# Altium footprint library SPECIAL.PcbLib: 68 footprints (part 2 of 5)
Each footprint in its own frame and in the unit in brackets; x right, y up, seen from the top. Pads: shape width x height; smd on the part's side, far side on the other; paste and mask are expansions set on the pad; w line width, h text height; cw(c..) or ccw(c..) is an arc to the next point about the centre after c.
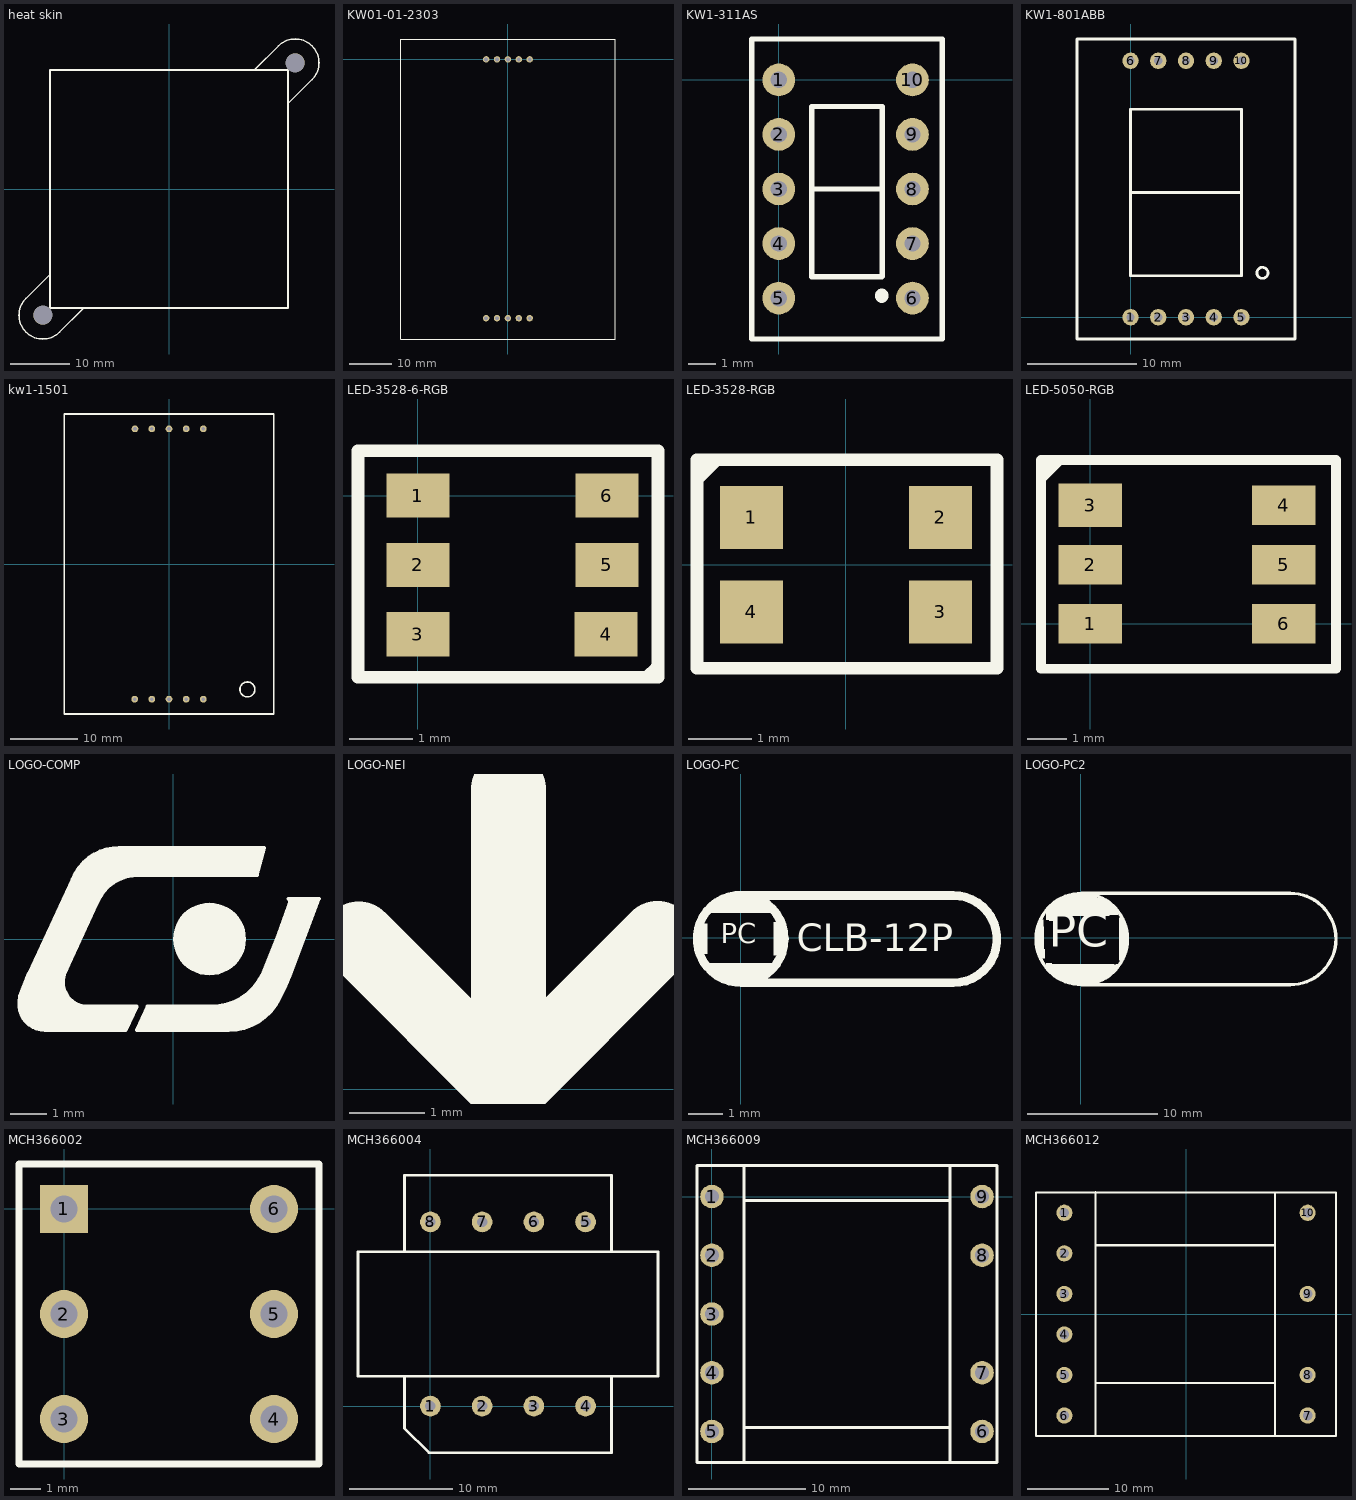
[diagram p1: the footprints below, top view; thin cyan lines are the x and y axes]

## heat skin [mm]
pads (2):
  round 3.2 hole 3.2 unplated: ""(-21.21,-21.21) ""(21.21,21.21)
Top Overlay:
  lines w0.254: -24.038,-18.382 ccw(c-21.21,-21.21) -18.382,-24.038 ; -24.038,-18.38 -20.014,-14.356 ; -18.382,-24.04 -14.366,-20.024 ; 14.376,20.034 18.382,24.04 ; 18.382,24.038 cw(c21.21,21.21) 24.038,18.382 ; 20.009,14.351 24.038,18.38 ; -20,-20 -20,20 20,20 20,-20 -20,-20

## KW01-01-2303 [mm]
pads (10):
  round 1.5 hole 0.9: 1(-5.08,-60.396) 2(-2.54,-60.396) 3(0,-60.396) 4(2.54,-60.396) 5(5.08,-60.396) 6(5.08,0) 7(2.54,0) 8(0,0) 9(-2.54,0) 10(-5.08,0)
Top Overlay:
  lines w0.254: 25,-65.246 -25,-65.246 -25,4.754 25,4.754 ; 25.038,-65.246 25.038,4.754
3D body "User Library-King Bright SA23-11.STEP": height 12, standoff -4, extent -23.974,-65.3 24.026,4.7

## KW1-311AS [mm]
height 5
pads (10):
  round 1.2 hole 0.6: 1(0,0) 2(0,-2) 3(0,-4) 4(0,-6) 5(0,-8) 6(4.9,-8) 7(4.9,-6) 8(4.9,-4) 9(4.9,-2) 10(4.9,0)
Top Overlay:
  lines w0.2: 1.2,-4 3.8,-4 ; 3.775,-7.225 1.2,-7.225 1.2,-0.975 3.8,-0.975 3.8,-7.2 ; -1,-9.5 6,-9.5 6,1.5 -1,1.5 -1,-9.5
  lines w0.5: 3.775,-7.925 3.775,-7.9
3D body: height 5.01, standoff 5, extent 4.902,-8.5 5.5,-7.901
3D body: height 5.01, standoff 5, extent 0.651,-4.546 4.351,-3.546
3D body: height 5.01, standoff 5, extent 3.852,-3.846 4.852,-0.146
3D body: height 5.01, standoff 5, extent 3.851,-7.946 4.851,-4.246
3D body: height 5.01, standoff 5, extent 0.651,-8.445 4.351,-7.445
3D body: height 5.01, standoff 5, extent 0.151,-7.946 1.151,-4.246
3D body: height 5.01, standoff 5, extent 0.152,-3.845 1.152,-0.145
3D body: height 5.01, standoff 5, extent 0.652,-0.647 4.352,0.353
3D body: height 0, standoff -2, extent -0.223,-0.224 0.225,0.225
3D body: height 0, standoff -2, extent -0.223,-2.224 0.225,-1.775
3D body: height 0, standoff -2, extent -0.223,-4.224 0.225,-3.775
3D body: height 0, standoff -2, extent -0.223,-6.224 0.225,-5.775
3D body: height 0, standoff -2, extent -0.223,-8.224 0.225,-7.775
3D body: height 0, standoff -2, extent 4.677,-8.224 5.125,-7.775
3D body: height 0, standoff -2, extent 4.677,-6.224 5.125,-5.775
3D body: height 0, standoff -2, extent 4.677,-4.224 5.125,-3.775
3D body: height 0, standoff -2, extent 4.677,-2.224 5.125,-1.775
3D body: height 0, standoff -2, extent 4.677,-0.224 5.125,0.225
3D body: height 5, standoff 4.99, extent -1,-9.5 6,1.5
3D body: height 4.99, standoff 0.5, extent -1,-9.5 6,1.5
3D body: height 0.5, standoff 0.49, extent -0.5,-9 5.5,1
3D body: height 0.5, standoff 0, extent -1,-9.5 0,-8.5
3D body: height 0.5, standoff 0, extent 5,-9.5 6,-8.5
3D body: height 0.5, standoff 0, extent 5,0.5 6,1.5
3D body: height 0.5, standoff 0, extent -1,0.5 0,1.5

## KW1-801ABB [mm]
height 10
pads (10):
  round 1.5 hole 0.75: 1(0,0) 2(2.54,0) 3(5.08,0) 4(7.62,0) 5(10.16,0) 6(0,23.5) 7(2.54,23.5) 8(5.08,23.5) 9(7.62,23.5) 10(10.16,23.5)
Top Overlay:
  circle w0.25: c12.087,4.064 r0.508
  lines w0.25: 0,11.43 0,19.05 10.16,19.05 10.16,11.43 ; 0,11.43 10.16,11.43 ; 0,11.43 0,3.81 10.16,3.81 10.16,11.43 ; 0,11.43 10.16,11.43 ; -4.92,-2 15.08,-2 15.08,25.5 -4.92,25.5 -4.92,-2
3D body: height 9.9, standoff 9.9, extent 0.419,10.891 10.729,12.636
3D body: height 9.9, standoff 9.9, extent 10.425,12.104 13.695,22.393
3D body: height 9.9, standoff 9.9, extent 2.185,21.718 12.843,23.468
3D body: height 9.9, standoff 9.9, extent -2.547,1.129 0.722,11.418
3D body: height 9.9, standoff 9.9, extent -0.577,12.102 2.632,22.452
3D body: height 9.9, standoff 9.9, extent 8.513,1.068 11.722,11.418
3D body: height 9.9, standoff 9.9, extent -1.696,0.053 8.962,1.803
3D body: height 9.9, standoff 9.9, extent 11.104,-0.119 12.698,1.478
3D body: height 1.5, standoff 0, extent -4.92,-2 -2.92,0
3D body: height 1.5, standoff 0, extent 13.08,23.2 15.08,25.2
3D body: height 1.5, standoff 0, extent -4.92,23.2 -2.92,25.2
3D body: height 1.5, standoff 0, extent 13.08,-2 15.08,0
3D body: height 9.9, standoff 1, extent -3.92,-1 14.08,24.2
3D body: height 9.8, standoff 1, extent -4.92,24.2 15.08,25.2
3D body: height 9.8, standoff 1, extent -4.92,-2 15.08,-1
3D body: height 9.8, standoff 1, extent -4.92,-1 -3.92,24.2
3D body: height 9.8, standoff 1, extent 14.08,-1 15.08,24.2
3D body: height 9.9, standoff 9.8, extent -4.92,-2 15.08,25.2
3D body: height 1, standoff -2, extent -0.248,-0.249 0.25,0.25
3D body: height 1, standoff -2, extent 2.292,-0.249 2.79,0.25
3D body: height 1, standoff -2, extent 4.832,-0.249 5.33,0.25
3D body: height 1, standoff -2, extent 7.372,-0.249 7.87,0.25
3D body: height 1, standoff -2, extent 9.912,-0.249 10.41,0.25
3D body: height 1, standoff -2, extent -0.248,23.251 0.25,23.75
3D body: height 1, standoff -2, extent 2.292,23.251 2.79,23.75
3D body: height 1, standoff -2, extent 4.831,23.5 5.329,23.999
3D body: height 1, standoff -2, extent 7.371,23.5 7.869,23.999
3D body: height 1, standoff -2, extent 9.911,23.5 10.409,23.999

## kw1-1501 [mm]
pads (10):
  round 1 hole 0.55: A(5.08,20) B(2.54,20) C(2.54,-20) D(0,-20) DP(0,20) E(-2.54,-20) F(-2.54,20) G(-5.04,20) vcc(-5.08,-20) vcc(5.08,-20)
Top Overlay:
  circle w0.254: c11.606,-18.557 r1.105
  lines w0.254: -15.5,-22.2 -15.5,22.2 15.5,22.2 15.5,-22.2 -15.5,-22.2

## LED-3528-6-RGB [mm]
pads (6):
  rect 1x0.7 smd: 1(0,0) 2(0,-1.1) 3(0,-2.2) 4(2.99,-2.2) 5(3,-1.1) 6(3,0)
Top Overlay:
  lines w0.2: 3.656,-2.866 3.786,-2.736 ; -0.95,-2.88 3.813,-2.88 3.813,0.71 -0.95,0.71 -0.95,-2.88
3D body "User Library-PLCC4RGBCT-CA LED SMD RGB.STEP": height 1.9, standoff 0, extent -0.303,-2.509 3.196,0.291

## LED-3528-RGB [mm]
height 1.9
pads (4):
  rect 1x1 smd: 1(-1.5,0.75) 2(1.5,0.75) 3(1.5,-0.75) 4(-1.5,-0.75)
Top Overlay:
  lines w0.2: -2.357,1.355 -2.059,1.653 ; -2.363,-1.646 -2.363,1.664 2.4,1.664 2.4,-1.646 -2.363,-1.646
3D body "User Library-PLCC4RGBCT-CA LED SMD RGB.STEP": height 1.9, standoff 0, extent -1.746,-1.391 1.753,1.409

## LED-5050-RGB [mm]
pads (6):
  rect 1.6x1 smd: 1(-0.001,-0.003) 2(-0.001,1.497) 4(4.899,2.997) 5(4.899,1.497) 6(4.899,-0.003)
  rect 1.6x1.1 smd: 3(-0.001,2.997)
Top Overlay:
  lines w0.25: -1.248,-1.144 6.223,-1.144 6.223,4.146 -1.248,4.146 -1.248,-1.144
  lines w0.254: -1.247,3.67 -0.787,4.13 ; -1.233,3.879 ccw(c-1.233,4.022) -1.09,4.022 cw(c-1.003,4.022) -1.003,4.109
3D body "User Library-smd_led_5050.STEP": height 1.6, standoff 0, extent -0.181,-1.003 5.119,3.997

## LOGO-COMP [mm] "logo"
pads (1):
  round 2 on Top Overlay: ""(1,0)
Top Overlay:
  rectangle: -1.24,-2.41 -1.22,-2.35
  region: 2.5,2.5 2.4,2.125 2.3,1.75 -1.275,1.725 -1.775,1.45 -2.09,0.98 -2.515,0.055 -2.928,-0.843 -3.025,-1.075 -3,-1.375 -2.875,-1.65 -2.575,-1.8 -2.346,-1.85 -1,-1.85 -1.15,-2.175 -1.3,-2.5 -3.525,-2.5 -3.895,-2.386 -4.15,-2.125 -4.202,-1.823 -4.202,-1.57 -2.752,1.642 -2.481,2.096 -2.09,2.38 -1.472,2.5
  region: 4,1.1 3.184,-0.99 2.85,-1.739 2.519,-2.175 2.054,-2.404 1.522,-2.5 -1,-2.5 -0.85,-2.175 -0.7,-1.85 1.05,-1.85 1.625,-1.739 2.175,-1.375 2.442,-0.99 3.184,1.072
  lines w0.1: -4.202,-1.58 -4.22,-1.72 ccw(c-3.501,-1.778) -3.508,-2.5 ; -4.202,-1.57 -4.078,-1.258 ; -4.134,-1.4 -4.01,-1.088 ; -4.074,-1.254 -3.95,-0.943 -2.757,1.636 -2.757,1.637 cw(c-1.488,1.139) -1.472,2.5 ; -3.501,-2.5 -1.3,-2.5 -1,-1.85 -2.346,-1.85 ; -2.94,-0.87 -2.09,0.98 ; -2.915,-0.823 ccw(c-2.346,-1.178) -2.34,-1.85 ; -2.089,0.978 cw(c-0.956,0.532) -0.923,1.75 ; -1.488,2.5 2.5,2.5 2.3,1.75 -0.956,1.75 ; 1.052,-1.85 ccw(c1.056,-0.307) 2.442,-0.985 ; 1.056,-1.85 -0.7,-1.85 -1,-2.5 1.526,-2.5 ; 1.522,-2.5 ccw(c1.526,-0.957) 2.912,-1.635 ; 2.442,-0.99 3.208,0.919 ; 2.912,-1.636 3.093,-1.266 ; 3.093,-1.26 3.2,-1 4,1.1 3.16,1.1 ; 3.184,1.072 cw(c3.049,0.974) 3.216,0.974 ; 3.208,0.923 ccw(c3.073,0.974) 3.217,0.974

## LOGO-NEI [mm]
Top Overlay:
  lines w1: -1.998,2.003 0,0.005 ; -0.007,0.008 1.991,2.006 ; 0,0 0,4

## LOGO-PC [mm]
Top Overlay:
  circle w0.254: c-0.005,-0.038 r1.278
  rectangle: -1.201,-0.481 -0.977,0.409
  rectangle: 0.953,-0.521 1.19,0.462
  region: -0.925,-0.75 0.95,-0.75 1.025,-0.825 0.65,-1.2 -0.625,-1.2 -0.675,-1.15
  region: -1.05,0.7 -1.025,0.725 0.95,0.725 0.45,1.225 -0.35,1.225
  lines w0.254: 0.011,-1.325 6.212,-1.325 ccw(c6.212,-0.047) 6.212,1.231 0.011,1.231
  text "CLB-12P" at 1.639,-0.399 h0.8
  text "PC" at -0.586,-0.358 h1

## LOGO-PC2 [mm]
Top Overlay:
  circle w0.254: c0.072,-0.112 r3.5
  rectangle: 3.133,-1.156 3.513,0.954
  rectangle: -1.177,2.464 1.133,3.294
  rectangle: 0.983,2.444 1.783,3.044
  rectangle: -1.847,2.574 -0.767,2.844
  rectangle: -1.597,2.644 -0.977,3.064
  rectangle: 0.753,2.974 1.253,3.184
  rectangle: 1.313,2.574 1.993,2.814
  rectangle: 2.313,1.984 2.603,2.344
  rectangle: -0.687,-3.576 0.453,-2.616
  rectangle: 0.072,-3.576 1.003,-2.746
  rectangle: -2.447,1.284 -1.997,2.434
  rectangle: -1.047,-3.496 -0.547,-2.746
  rectangle: -1.377,-3.296 -0.947,-2.716
  rectangle: -1.617,-3.236 -1.197,-2.846
  rectangle: 0.953,-3.406 1.363,-2.756
  rectangle: 1.173,-3.296 1.683,-2.756
  rectangle: 1.403,-3.126 1.823,-2.716
  rectangle: 1.993,1.734 2.473,2.574
  rectangle: 2.323,1.764 2.673,2.144
  rectangle: 2.473,1.734 2.853,2.064
  rectangle: -1.927,-3.016 2.113,-2.716
  rectangle: -2.677,1.324 -2.247,2.224
  rectangle: -2.177,1.654 2.183,2.664
  rectangle: -2.367,-2.736 2.533,-2.026
  rectangle: -2.667,-2.446 -2.207,-1.946
  rectangle: -2.087,-2.956 -1.307,-2.596
  rectangle: -1.927,-3.096 -1.547,-2.716
  rectangle: 2.053,-2.846 2.223,-2.586
  rectangle: 2.463,-2.356 2.783,-2.066
  rectangle: 2.463,-2.436 2.623,-2.356
  rectangle: 2.703,-2.196 2.893,-2.026
  rectangle: 2.933,-1.756 3.303,1.534
  rectangle: -3.357,-0.936 -2.797,0.854
  rectangle: -3.207,-1.606 -2.747,-0.866
  rectangle: -3.177,0.744 -2.867,1.394
  lines w0.254: 0.072,-3.612 16.031,-3.612 ccw(c16.031,-0.112) 16.031,3.388 0.072,3.388
  text "PC" at -2.447,-1.546 h4.4

## MCH366002 [mm]
height 13
pads (6):
  rect 1.6x1.6 hole 0.9: 1(0,0)
  round 1.6 hole 0.9: 2(0,-3.5) 3(0,-7) 4(7,-7) 5(7,-3.5) 6(7,0)
Top Overlay:
  lines w0.25: -1.5,-8.5 8.5,-8.5 8.5,1.5 -1.5,1.5 -1.5,-8.5

## MCH366004 [mm]
height 26
pads (8):
  round 2 hole 1: 1(0,0) 2(5,0) 3(10,0) 4(15,0) 5(15,17.8) 6(10,17.8) 7(5,17.8) 8(0,17.8)
Top Overlay:
  lines w0.254: -2.5,2.9 -2.5,-2.15 -0.15,-4.5 17.5,-4.5 17.5,2.9 ; -2.5,14.9 -2.5,22.3 17.5,22.3 17.5,14.9 ; -7,2.9 -7,14.9 22,14.9 22,2.9 -7,2.9
3D body: height 25.6, standoff 25.6, extent -6.9,3 21.9,14.8
3D body: height 25.6, standoff 0, extent -6.901,3 -6.9,14.8
3D body: height 25.6, standoff 0, extent 21.9,3 21.901,14.8
3D body: height 0.01, standoff -0.01, extent -6.9,3 21.9,14.8
3D body: height 5.6, standoff 4, extent -2.2,-4.29 17.2,22.11
3D body: height 20, standoff 5.6, extent -1.24,-1.79 16.36,19.91
3D body: height 25.6, standoff 21.6, extent -6.9,3 21.9,14.8
3D body: height 4, standoff 0, extent -6.9,3 21.9,14.8
3D body: height 21.6, standoff 4, extent -6.9,3 -2.9,14.8
3D body: height 21.6, standoff 4, extent 17.9,3 21.9,14.8
3D body: height 21.6, standoff 20, extent -2.2,-4.29 17.2,22.11
3D body: height 0, standoff -5, extent -0.496,-0.499 0.5,0.499
3D body: height 0, standoff -5, extent 4.504,-0.499 5.5,0.499
3D body: height 0, standoff -5, extent 9.504,-0.499 10.5,0.499
3D body: height 0, standoff -5, extent 14.504,-0.499 15.5,0.499
3D body: height 0, standoff -5, extent 14.504,17.291 15.5,18.289
3D body: height 0, standoff -5, extent 9.504,17.291 10.5,18.289
3D body: height 0, standoff -5, extent 4.504,17.291 5.5,18.289
3D body: height 0, standoff -5, extent -0.496,17.291 0.5,18.289

## MCH366009 [mm]
pads (9):
  round 2 hole 1.2: 1(0,0) 2(0,-5) 3(0,-10) 4(0,-15) 5(0,-20) 6(23,-20) 7(23,-15) 8(23,-5) 9(23,0)
Top Overlay:
  lines w0.254: 2.73,-22.66 2.73,2.57 ; 2.74,-0.34 20.26,-0.34 ; 2.85,-19.66 20.27,-19.66 ; 20.27,-22.61 20.27,2.61 ; -1.27,-22.66 24.27,-22.66 24.27,2.66 -1.27,2.66 -1.27,-22.66

## MCH366012 [mm]
pads (10):
  round 2 hole 1.2: 1(-15,12.505) 2(-15,7.505) 3(-15,2.504) 4(-15,-2.497) 5(-15,-7.498) 6(-15,-12.5) 7(15,-12.5) 8(15,-7.498) 9(15,2.504) 10(15,12.505)
Top Overlay:
  lines w0.254: -11.182,-14.955 -11.182,15.045 ; -11.041,8.5 10.923,8.5 ; -10.991,-8.5 10.923,-8.5 ; 10.998,-15 10.998,15 ; -18.5,-15 18.5,-15 18.5,15 -18.5,15 -18.5,-15